# Altium footprint library Connectors THD.PcbLib: 631 footprints (part 13 of 46) (continued)
## FCI_54602-908LF [mm] "1 Port, 8 Positions, CAT3 RJ45 Horizontal Modular Jack"
height 10
pads (10):
  round 1.5 hole 0.8: 1(4.445,1.27) 2(3.175,-1.27) 3(1.905,1.27) 4(0.635,-1.27) 5(-0.635,1.27) 6(-1.905,-1.27) 7(-3.171,1.27) 8(-4.445,-1.27)
  round 1 hole 3.2 unplated mask+1.1: M1(-5.715,7.62) M2(5.715,7.62)
Top Overlay:
  lines w0.2: -6.6,-2.46 -6.6,-2.5 6.6,-2.5 6.6,-2.46 ; -7.65,-2.46 7.65,-2.46 7.65,15.24 -7.65,15.24 -7.65,-2.46
  text "1" at 6.03,0.6 h1.2
Mechanical 8:
  circle w0.1: c5.715,7.62 r1.6
  circle w0.1: c-5.715,7.62 r1.6
  circle w0.1: c4.445,1.27 r0.415
  circle w0.1: c-3.175,1.27 r0.415
  circle w0.1: c-4.445,-1.27 r0.415
  circle w0.1: c3.175,-1.27 r0.415
  lines w0.1: -6.215,7.62 -5.715,7.62 ; -5.715,7.12 -5.715,7.62 ; -5.715,8.12 -5.715,7.62 ; -5.215,7.62 -5.715,7.62 ; -4.945,-1.27 -4.445,-1.27 ; -4.445,-1.77 -4.445,-1.27 ; -4.445,-0.77 -4.445,-1.27 ; -3.945,-1.27 -4.445,-1.27 ; -3.675,1.27 -3.175,1.27 ; -3.175,0.77 -3.175,1.27 ; -3.175,1.77 -3.175,1.27 ; -2.675,1.27 -3.175,1.27 ; -2.405,-1.27 -1.905,-1.27 ; -1.905,-1.77 -1.905,-1.27 ; -1.905,-0.77 -1.905,-1.27 ; -1.405,-1.27 -1.905,-1.27 ; -1.135,1.27 -0.635,1.27 ; -0.635,0.77 -0.635,1.27 ; -0.635,1.77 -0.635,1.27 ; -0.5,0 0,0 ; -0.135,1.27 -0.635,1.27 ; 0,-0.5 0,0 ; 0,0.5 0,0 ; 0.135,-1.27 0.635,-1.27 ; 0.5,0 0,0 ; 0.635,-1.77 0.635,-1.27 ; 0.635,-0.77 0.635,-1.27 ; 1.135,-1.27 0.635,-1.27 ; 1.405,1.27 1.905,1.27 ; 1.905,0.77 1.905,1.27 ; 1.905,1.77 1.905,1.27 ; 2.405,1.27 1.905,1.27 ; 2.675,-1.27 3.175,-1.27 ; 3.175,-1.77 3.175,-1.27 ; 3.175,-0.77 3.175,-1.27 ; 3.675,-1.27 3.175,-1.27 ; 3.945,1.27 4.445,1.27 ; 4.445,0.77 4.445,1.27 ; 4.445,1.77 4.445,1.27 ; 4.945,1.27 4.445,1.27 ; 5.215,7.62 5.715,7.62 ; 5.715,7.12 5.715,7.62 ; 5.715,8.12 5.715,7.62 ; 6.215,7.62 5.715,7.62
Mechanical 14:
  lines w0.1: -6.6,-2.46 -6.6,-2.5 6.6,-2.5 6.6,-2.46 ; -7.65,-2.46 7.65,-2.46 7.65,15.24 -7.65,15.24 -7.65,-2.46
  text "1" at 6.03,0.6 h1.2
3D body: height 12.7, standoff -3.5, extent -7.65,-2.5 7.65,15.24

## FCI_72309-8034BLF [mm] "Dual USB Type A 4 Pin Receptacle, Right Angle, Shielded"
height 15.5
pads (12):
  round 1.6 hole 0.9: A1(-3.5,1.31) A2(-1,1.31) A3(1,1.31) A4(3.5,1.31) B1(-3.5,-1.31) B2(-1,-1.31) B3(1,-1.31) B4(3.5,-1.31)
  round 3 hole 2.3: SH(-6.57,-4.02) SH(-6.57,1.66) SH(6.57,-4.02) SH(6.57,1.66)
Top Overlay:
  circle w0.5: c-3.525,3.525 r0.25
  lines w0.2: -6.555,-14.214 -6.555,-14.3 ccw(c-5.95,-14.3) -5.973,-14.905 -0.78,-15.1 ccw(c-0.755,-14.433) -0.305,-14.925 -0.511,-14.7 cw(c-0.755,-14.433) -0.769,-14.795 -5.961,-14.6 cw(c-5.95,-14.3) -6.25,-14.3 -6.25,-13.68 cw(c-6.87,-13.68) -6.87,-14.3 -7.25,-14.301 -7.25,-13.995 -6.87,-13.995 ccw(c-6.87,-13.68) -6.555,-13.68 ; -6.555,-5.82 -6.555,-13.68 ; -6.555,-2.22 -6.555,-0.14 ; -6.2,-13.68 -6.2,-14.3 6.2,-14.3 6.2,-13.68 ; -5.6,-14.3 -5.6,-13.68 ; -5.6,-13.995 5.6,-13.995 ; -5.102,2.701 5.086,2.7 ; -4.094,-13.68 -6.555,-13.68 ; -4.085,-13.724 -4.602,-6.88 -4,-6.88 -3.55,-12.84 -2.45,-12.84 -2,-6.88 -1.398,-6.88 -1.915,-13.73 -4.085,-13.73 ; 0.755,-14.795 5.961,-14.6 ccw(c5.95,-14.3) 6.25,-14.3 6.25,-13.68 ccw(c6.87,-13.68) 6.87,-14.3 7.25,-14.3 7.25,-13.995 6.87,-13.995 cw(c6.87,-13.68) 6.555,-13.68 ; 0.769,-14.795 cw(c0.755,-14.433) 0.511,-14.7 0.305,-14.925 ccw(c0.755,-14.433) 0.78,-15.1 5.973,-14.905 ccw(c5.95,-14.3) 6.555,-14.3 6.555,-14.214 ; 1.915,-13.73 4.085,-13.73 4.602,-6.88 4,-6.88 3.55,-12.84 2.45,-12.84 2,-6.88 1.398,-6.88 1.915,-13.724 ; 4.088,-13.68 6.555,-13.68 ; 5.6,-14.3 5.6,-13.68 ; 6.555,-5.82 6.555,-13.68 ; 6.555,-2.22 6.555,-0.14
  text "B" at -5.613,-1.75 h1
  text "1" at -3.685,-3.5 h1
  text "4" at 3.148,-3.5 h1
Mechanical 8:
  lines w0.1: -7.07,-4.02 -6.57,-4.02 ; -7.07,1.66 -6.57,1.66 ; -6.57,-4.52 -6.57,-4.02 ; -6.57,-3.52 -6.57,-4.02 ; -6.57,1.16 -6.57,1.66 ; -6.57,2.16 -6.57,1.66 ; -6.07,-4.02 -6.57,-4.02 ; -6.07,1.66 -6.57,1.66 ; -4,-1.31 -3.5,-1.31 ; -4,1.31 -3.5,1.31 ; -3.5,-1.81 -3.5,-1.31 ; -3.5,-0.81 -3.5,-1.31 ; -3.5,0.81 -3.5,1.31 ; -3.5,1.81 -3.5,1.31 ; -3,-1.31 -3.5,-1.31 ; -3,1.31 -3.5,1.31 ; -1.5,-1.31 -1,-1.31 ; -1.5,1.31 -1,1.31 ; -1,-1.81 -1,-1.31 ; -1,-0.81 -1,-1.31 ; -1,0.81 -1,1.31 ; -1,1.81 -1,1.31 ; -0.5,-1.31 -1,-1.31 ; -0.5,0 0,0 ; -0.5,1.31 -1,1.31 ; 0,-0.5 0,0 ; 0,0.5 0,0 ; 0.5,-1.31 1,-1.31 ; 0.5,0 0,0 ; 0.5,1.31 1,1.31 ; 1,-1.81 1,-1.31 ; 1,-0.81 1,-1.31 ; 1,0.81 1,1.31 ; 1,1.81 1,1.31 ; 1.5,-1.31 1,-1.31 ; 1.5,1.31 1,1.31 ; 3,-1.31 3.5,-1.31 ; 3,1.31 3.5,1.31 ; 3.5,-1.81 3.5,-1.31 ; 3.5,-0.81 3.5,-1.31 ; 3.5,0.81 3.5,1.31 ; 3.5,1.81 3.5,1.31 ; 4,-1.31 3.5,-1.31 ; 4,1.31 3.5,1.31 ; 6.07,-4.02 6.57,-4.02 ; 6.07,1.66 6.57,1.66 ; 6.57,-4.52 6.57,-4.02 ; 6.57,-3.52 6.57,-4.02 ; 6.57,1.16 6.57,1.66 ; 6.57,2.16 6.57,1.66 ; 7.07,-4.02 6.57,-4.02 ; 7.07,1.66 6.57,1.66
Mechanical 14:
  lines w0.1: -6.555,-14.214 -6.555,-14.3 ccw(c-5.95,-14.3) -5.973,-14.905 -0.78,-15.1 ccw(c-0.755,-14.433) -0.305,-14.925 -0.511,-14.7 cw(c-0.755,-14.433) -0.769,-14.795 -5.961,-14.6 cw(c-5.95,-14.3) -6.25,-14.3 -6.25,-13.68 cw(c-6.87,-13.68) -6.87,-14.3 -7.25,-14.301 -7.25,-13.995 -6.87,-13.995 ccw(c-6.87,-13.68) -6.555,-13.68 ; -6.555,1 -7.5,1 -7.5,2 -6.555,2 ; -6.555,2.701 6.555,2.7 ; -6.25,2.7 -6.25,2.918 -6.555,2.918 -6.555,-13.68 ; -6.2,-13.68 -6.2,-14.3 6.2,-14.3 6.2,-13.68 ; -5.6,-14.3 -5.6,-13.68 ; -5.6,-13.995 5.6,-13.995 ; -4.094,-13.68 -6.555,-13.68 ; -4.085,-13.724 -4.602,-6.88 -4,-6.88 -3.55,-12.84 -2.45,-12.84 -2,-6.88 -1.398,-6.88 -1.915,-13.73 -4.085,-13.73 ; 0.755,-14.795 5.961,-14.6 ccw(c5.95,-14.3) 6.25,-14.3 6.25,-13.68 ccw(c6.87,-13.68) 6.87,-14.3 7.25,-14.3 7.25,-13.995 6.87,-13.995 cw(c6.87,-13.68) 6.555,-13.68 ; 0.769,-14.795 cw(c0.755,-14.433) 0.511,-14.7 0.305,-14.925 ccw(c0.755,-14.433) 0.78,-15.1 5.973,-14.905 ccw(c5.95,-14.3) 6.555,-14.3 6.555,-14.214 ; 1.915,-13.73 4.085,-13.73 4.602,-6.88 4,-6.88 3.55,-12.84 2.45,-12.84 2,-6.88 1.398,-6.88 1.915,-13.724 ; 4.088,-13.68 6.555,-13.68 ; 5.6,-14.3 5.6,-13.68 ; 6.25,2.7 6.25,2.918 6.555,2.918 6.555,-13.68 ; 6.555,1 7.5,1 7.5,2 6.555,2
  text "B" at -5.613,-1.75 h1
  text "1" at -3.685,-3.5 h1
  text "4" at 3.148,-3.5 h1
3D body: height 16.19, standoff -2.8, extent -7.5,-15.099 7.5,2.918

## FCI_76341-312LF [mm] "2.54mm (.100\") Pitch, 12 Circuits  Single Row  Top Entry Through Mount Receptacle"
height 7
pads (12):
  round 1.5 hole 0.8: 1(-13.97,0) 2(-11.43,0) 3(-8.89,0) 4(-6.35,0) 5(-3.81,0) 6(-1.27,0) 7(1.27,0) 8(3.81,0) 9(6.35,0) 10(8.89,0) 11(11.43,0) 12(13.97,0)
Top Overlay:
  circle w0.3: c-14.478,1.778 r0.15
  lines w0.2: -15.2,-1.27 -15.2,1.27 15.2,1.27 15.2,-1.27 -15.2,-1.27
Mechanical 8:
  lines w0.1: -14.47,0 -13.97,0 ; -13.97,-0.5 -13.97,0 ; -13.97,0.5 -13.97,0 ; -13.47,0 -13.97,0 ; -11.93,0 -11.43,0 ; -11.43,-0.5 -11.43,0 ; -11.43,0.5 -11.43,0 ; -10.93,0 -11.43,0 ; -9.39,0 -8.89,0 ; -8.89,-0.5 -8.89,0 ; -8.89,0.5 -8.89,0 ; -8.39,0 -8.89,0 ; -6.85,0 -6.35,0 ; -6.35,-0.5 -6.35,0 ; -6.35,0.5 -6.35,0 ; -5.85,0 -6.35,0 ; -4.31,0 -3.81,0 ; -3.81,-0.5 -3.81,0 ; -3.81,0.5 -3.81,0 ; -3.31,0 -3.81,0 ; -1.77,0 -1.27,0 ; -1.27,-0.5 -1.27,0 ; -1.27,0.5 -1.27,0 ; -0.77,0 -1.27,0 ; -0.5,0 0,0 ; 0,-0.5 0,0 ; 0,0.5 0,0 ; 0.5,0 0,0 ; 0.77,0 1.27,0 ; 1.27,-0.5 1.27,0 ; 1.27,0.5 1.27,0 ; 1.77,0 1.27,0 ; 3.31,0 3.81,0 ; 3.81,-0.5 3.81,0 ; 3.81,0.5 3.81,0 ; 4.31,0 3.81,0 ; 5.85,0 6.35,0 ; 6.35,-0.5 6.35,0 ; 6.35,0.5 6.35,0 ; 6.85,0 6.35,0 ; 8.39,0 8.89,0 ; 8.89,-0.5 8.89,0 ; 8.89,0.5 8.89,0 ; 9.39,0 8.89,0 ; 10.93,0 11.43,0 ; 11.43,-0.5 11.43,0 ; 11.43,0.5 11.43,0 ; 11.93,0 11.43,0 ; 13.47,0 13.97,0 ; 13.97,-0.5 13.97,0 ; 13.97,0.5 13.97,0 ; 14.47,0 13.97,0
Mechanical 14:
  circle w0.3: c-14.478,1.778 r0.15
  lines w0.1: -14.77,-0.8 -13.17,-0.8 ; -14.77,-0.8 -14.77,0.8 ; -14.77,-0.8 -14.47,-0.5 ; -14.77,0.8 -13.17,0.8 ; -14.77,0.8 -14.47,0.5 ; -14.47,-0.5 -14.47,0.5 ; -14.47,-0.5 -13.47,-0.5 ; -14.47,0.5 -13.47,0.5 ; -13.47,-0.5 -13.17,-0.8 ; -13.47,-0.5 -13.47,0.5 ; -13.47,0.5 -13.17,0.8 ; -13.17,-0.8 -13.17,0.8 ; -12.23,-0.8 -10.63,-0.8 ; -12.23,-0.8 -12.23,0.8 ; -12.23,-0.8 -11.93,-0.5 ; -12.23,0.8 -10.63,0.8 ; -12.23,0.8 -11.93,0.5 ; -11.93,-0.5 -11.93,0.5 ; -11.93,-0.5 -10.93,-0.5 ; -11.93,0.5 -10.93,0.5 ; -10.93,-0.5 -10.63,-0.8 ; -10.93,-0.5 -10.93,0.5 ; -10.93,0.5 -10.63,0.8 ; -10.63,-0.8 -10.63,0.8 ; -9.69,-0.8 -8.09,-0.8 ; -9.69,-0.8 -9.69,0.8 ; -9.69,-0.8 -9.39,-0.5 ; -9.69,0.8 -8.09,0.8 ; -9.69,0.8 -9.39,0.5 ; -9.39,-0.5 -9.39,0.5 ; -9.39,-0.5 -8.39,-0.5 ; -9.39,0.5 -8.39,0.5 ; -8.39,-0.5 -8.09,-0.8 ; -8.39,-0.5 -8.39,0.5 ; -8.39,0.5 -8.09,0.8 ; -8.09,-0.8 -8.09,0.8 ; -7.15,-0.8 -5.55,-0.8 ; -7.15,-0.8 -7.15,0.8 ; -7.15,-0.8 -6.85,-0.5 ; -7.15,0.8 -5.55,0.8 ; -7.15,0.8 -6.85,0.5 ; -6.85,-0.5 -6.85,0.5 ; -6.85,-0.5 -5.85,-0.5 ; -6.85,0.5 -5.85,0.5 ; -5.85,-0.5 -5.55,-0.8 ; -5.85,-0.5 -5.85,0.5 ; -5.85,0.5 -5.55,0.8 ; -5.55,-0.8 -5.55,0.8 ; -4.61,-0.8 -3.01,-0.8 ; -4.61,-0.8 -4.61,0.8 ; -4.61,-0.8 -4.31,-0.5 ; -4.61,0.8 -3.01,0.8 ; -4.61,0.8 -4.31,0.5 ; -4.31,-0.5 -4.31,0.5 ; -4.31,-0.5 -3.31,-0.5 ; -4.31,0.5 -3.31,0.5 ; -3.31,-0.5 -3.01,-0.8 ; -3.31,-0.5 -3.31,0.5 ; -3.31,0.5 -3.01,0.8 ; -3.01,-0.8 -3.01,0.8 ; -2.07,-0.8 -0.47,-0.8 ; -2.07,-0.8 -2.07,0.8 ; -2.07,-0.8 -1.77,-0.5 ; -2.07,0.8 -0.47,0.8 ; -2.07,0.8 -1.77,0.5 ; -1.77,-0.5 -1.77,0.5 ; -1.77,-0.5 -0.77,-0.5 ; -1.77,0.5 -0.77,0.5 ; -0.77,-0.5 -0.47,-0.8 ; -0.77,-0.5 -0.77,0.5 ; -0.77,0.5 -0.47,0.8 ; -0.47,-0.8 -0.47,0.8 ; 0.47,-0.8 2.07,-0.8 ; 0.47,-0.8 0.47,0.8 ; 0.47,-0.8 0.77,-0.5 ; 0.47,0.8 2.07,0.8 ; 0.47,0.8 0.77,0.5 ; 0.77,-0.5 0.77,0.5 ; 0.77,-0.5 1.77,-0.5 ; 0.77,0.5 1.77,0.5 ; 1.77,-0.5 2.07,-0.8 ; 1.77,-0.5 1.77,0.5 ; 1.77,0.5 2.07,0.8 ; 2.07,-0.8 2.07,0.8 ; 3.01,-0.8 4.61,-0.8 ; 3.01,-0.8 3.01,0.8 ; 3.01,-0.8 3.31,-0.5 ; 3.01,0.8 4.61,0.8 ; 3.01,0.8 3.31,0.5 ; 3.31,-0.5 3.31,0.5 ; 3.31,-0.5 4.31,-0.5 ; 3.31,0.5 4.31,0.5 ; 4.31,-0.5 4.61,-0.8 ; 4.31,-0.5 4.31,0.5 ; 4.31,0.5 4.61,0.8 ; 4.61,-0.8 4.61,0.8 ; 5.55,-0.8 7.15,-0.8 ; 5.55,-0.8 5.55,0.8 ; 5.55,-0.8 5.85,-0.5 ; 5.55,0.8 7.15,0.8 ; 5.55,0.8 5.85,0.5 ; 5.85,-0.5 5.85,0.5 ; 5.85,-0.5 6.85,-0.5 ; 5.85,0.5 6.85,0.5 ; 6.85,-0.5 7.15,-0.8 ; 6.85,-0.5 6.85,0.5 ; 6.85,0.5 7.15,0.8 ; 7.15,-0.8 7.15,0.8 ; 8.09,-0.8 9.69,-0.8 ; 8.09,-0.8 8.09,0.8 ; 8.09,-0.8 8.39,-0.5 ; 8.09,0.8 9.69,0.8 ; 8.09,0.8 8.39,0.5 ; 8.39,-0.5 8.39,0.5 ; 8.39,-0.5 9.39,-0.5 ; 8.39,0.5 9.39,0.5 ; 9.39,-0.5 9.69,-0.8 ; 9.39,-0.5 9.39,0.5 ; 9.39,0.5 9.69,0.8 ; 9.69,-0.8 9.69,0.8 ; 10.63,-0.8 12.23,-0.8 ; 10.63,-0.8 10.63,0.8 ; 10.63,-0.8 10.93,-0.5 ; 10.63,0.8 12.23,0.8 ; 10.63,0.8 10.93,0.5 ; 10.93,-0.5 10.93,0.5 ; 10.93,-0.5 11.93,-0.5 ; 10.93,0.5 11.93,0.5 ; 11.93,-0.5 12.23,-0.8 ; 11.93,-0.5 11.93,0.5 ; 11.93,0.5 12.23,0.8 ; 12.23,-0.8 12.23,0.8 ; 13.17,-0.8 14.77,-0.8 ; 13.17,-0.8 13.17,0.8 ; 13.17,-0.8 13.47,-0.5 ; 13.17,0.8 14.77,0.8 ; 13.17,0.8 13.47,0.5 ; 13.47,-0.5 13.47,0.5 ; 13.47,-0.5 14.47,-0.5 ; 13.47,0.5 14.47,0.5 ; 14.47,-0.5 14.77,-0.8 ; 14.47,-0.5 14.47,0.5 ; 14.47,0.5 14.77,0.8 ; 14.77,-0.8 14.77,0.8 ; -15.2,-1.27 -15.2,1.27 15.2,1.27 15.2,-1.27 -15.2,-1.27
3D body: height 7, standoff -2.96, extent -15.2,-1.27 15.2,1.27

## FCI_87520-0010BLF [mm] "USB 2.0 Type A Receptacle, 4 Pins, Right Angle, Shielded"
height 7.7
pads (6):
  round 1.6 hole 0.9: 1(-3.5,0) 2(-1,0) 3(1,0) 4(3.5,0)
  round 2.8 hole 2.3: 5(-6.57,-2.71) 5(6.57,-2.71)
Top Overlay:
  circle w0.5: c-3.515,2 r0.25
  lines w0.2: -6.537,-12.26 6.563,-12.26 ; -6.537,-4.46 -6.537,-12.41 cw(c-6.837,-12.41) -6.837,-12.71 -7.237,-12.71 -7.237,-13.01 -6.837,-13.01 ccw(c-6.837,-12.41) -6.237,-12.41 -6.237,-12.26 ; -6.537,-0.96 -6.537,0.99 -4.075,0.99 ; -5.537,-12.71 5.563,-12.71 ; -5.537,-12.26 -5.537,-13.01 5.563,-13.01 5.563,-12.26 ; 4.101,0.99 6.563,0.99 6.563,-0.96 ; 6.263,-12.26 6.263,-12.41 ccw(c6.863,-12.41) 6.863,-13.01 7.263,-13.01 7.263,-12.71 6.863,-12.71 cw(c6.863,-12.41) 6.563,-12.41 6.563,-4.46
  text "1" at -3.66,-2.5 h1
  text "4" at 3.173,-2.5 h1
Mechanical 8:
  circle w0.1: c6.57,-2.71 r1.15
  circle w0.1: c3.487,0 r0.5
  circle w0.1: c-3.5,0 r0.5
  circle w0.1: c1,0 r0.5
  circle w0.1: c-1.013,0 r0.5
  circle w0.1: c-6.57,-2.71 r1.15
  lines w0.1: -7.57,-2.71 -6.57,-2.71 ; -6.57,-3.71 -6.57,-2.71 ; -6.537,-9 6.563,-9 ; -4.5,0 -3.5,0 ; -3.5,-2.71 -3.5,0 ; -3.5,-1 -3.5,0 ; -2,0 -1,0 ; -1,-2.71 -1,0 ; -1,-1 -1,0 ; 0,-2.71 0,0 ; 0.013,-13.01 0.013,0.99 ; 0.013,0 1.013,0 1.013,-1 ; 1,-2.71 1,0 ; 2.5,0 3.5,0 ; 3.5,-2.71 3.5,0 ; 3.5,-1 3.5,0 ; 5.57,-2.71 6.57,-2.71 ; 6.263,-13.01 7.263,-13.01 ; 6.563,-12.71 7.263,-12.71 ; 6.57,-3.71 6.57,-2.71 ; -6.57,-2.71 6.57,-2.71 ; -3.5,0 3.5,0 ; -3.713,-0.15 -3.713,0.15 -3.313,0.15 -3.313,-0.15 -3.713,-0.15 ; -1.213,-0.15 -1.213,0.15 -0.813,0.15 -0.813,-0.15 -1.213,-0.15 ; 0.8,-0.15 0.8,0.15 1.2,0.15 1.2,-0.15 0.8,-0.15 ; 3.287,-0.15 3.287,0.15 3.687,0.15 3.687,-0.15 3.287,-0.15
Mechanical 14:
  lines w0.1: -6.537,-12.26 6.563,-12.26 ; -6.237,-12.26 -6.237,-12.41 cw(c-6.837,-12.41) -6.837,-13.01 -7.237,-13.01 -7.237,-12.71 -6.837,-12.71 ccw(c-6.837,-12.41) -6.537,-12.41 -6.537,0.99 6.563,0.99 6.563,-12.41 ccw(c6.863,-12.41) 6.863,-12.71 7.263,-12.71 7.263,-13.01 6.863,-13.01 cw(c6.863,-12.41) 6.263,-12.41 6.263,-12.26 ; -5.537,-12.71 5.563,-12.71 ; -5.537,-12.26 -5.537,-13.01 5.563,-13.01 5.563,-12.26
  text "1" at -3.66,-2.5 h1
  text "4" at 3.173,-2.5 h1
3D body: height 7.55, standoff -3.3, extent -7.9,-13.05 7.9,1.11

## FCI_87606-310LF [mm] "20 Contacts - Pitch 2.54mm - Top Entry, Dual Row Through Mount Receptacle"
height 8.5
pads (20):
  round 1.5 hole 0.9: 1(-11.43,1.27) 2(-11.43,-1.27) 3(-8.89,1.27) 4(-8.89,-1.27) 5(-6.35,1.27) 6(-6.35,-1.27) 7(-3.81,1.27) 8(-3.81,-1.27) 9(-1.27,1.27) 10(-1.27,-1.27) 11(1.27,1.27) 12(1.27,-1.27) 13(3.81,1.27) 14(3.81,-1.27) 15(6.35,1.27) 16(6.35,-1.27) 17(8.89,1.27) 18(8.89,-1.27) 19(11.43,1.27) 20(11.43,-1.27)
Top Overlay:
  circle w0.3: c-11.357,3.048 r0.15
  lines w0.2: -12.66,-2.54 12.66,-2.54 12.66,2.54 -12.66,2.54 -12.66,-2.54
  text "1" at -13.462,0.762 h1.02
  text "20" at 13.081,-1.651 h1.02
Mechanical 14:
  drawing of 244 lines, arcs and shapes, not listed
  text "1" at -13.462,0.762 h1.02
  text "20" at 13.081,-1.651 h1.02
3D body: height 8.5, standoff -2.9, extent -12.7,-2.54 12.7,2.54

## FCI_87606-313LF [mm] "26 Contacts - Pitch 2.54mm - Top Entry, Dual Row Through Mount Receptacle"
height 8.5
pads (26):
  round 1.5 hole 0.9: 1(-15.24,1.27) 2(-15.24,-1.27) 3(-12.7,1.27) 4(-12.7,-1.27) 5(-10.16,1.27) 6(-10.16,-1.27) 7(-7.62,1.27) 8(-7.62,-1.27) 9(-5.08,1.27) 10(-5.08,-1.27) 11(-2.54,1.27) 12(-2.54,-1.27) 13(0,1.27) 14(0,-1.27) 15(2.54,1.27) 16(2.54,-1.27) 17(5.08,1.27) 18(5.08,-1.27) 19(7.62,1.27) 20(7.62,-1.27) 21(10.16,1.27) 22(10.16,-1.27) 23(12.7,1.27) 24(12.7,-1.27) 25(15.24,1.27) 26(15.24,-1.27)
Top Overlay:
  circle w0.3: c-15.167,3.048 r0.15
  lines w0.2: -16.47,-2.54 16.47,-2.54 16.47,2.54 -16.47,2.54 -16.47,-2.54
  text "1" at -17.272,0.762 h1.02
  text "26" at 16.891,-1.651 h1.02
Mechanical 14:
  drawing of 316 lines, arcs and shapes, not listed
  text "26" at 16.891,-1.651 h1.02
  text "1" at -17.272,0.762 h1.02
3D body: height 8.5, standoff -2.9, extent -16.51,-2.54 16.51,2.54

## FCI_87606-317LF [mm] "34 Contacts - Pitch 2.54mm - Top Entry, Dual Row Through Mount Receptacle"
height 8.5
pads (34):
  round 1.5 hole 0.9: 1(-20.32,1.27) 2(-20.32,-1.27) 3(-17.78,1.27) 4(-17.78,-1.27) 5(-15.24,1.27) 6(-15.24,-1.27) 7(-12.7,1.27) 8(-12.7,-1.27) 9(-10.16,1.27) 10(-10.16,-1.27) 11(-7.62,1.27) 12(-7.62,-1.27) 13(-5.08,1.27) 14(-5.08,-1.27) 15(-2.54,1.27) 16(-2.54,-1.27) 17(0,1.27) 18(0,-1.27) 19(2.54,1.27) 20(2.54,-1.27) 21(5.08,1.27) 22(5.08,-1.27) 23(7.62,1.27) 24(7.62,-1.27) 25(10.16,1.27) 26(10.16,-1.27) 27(12.7,1.27) 28(12.7,-1.27) 29(15.24,1.27) 30(15.24,-1.27) 31(17.78,1.27) 32(17.78,-1.27) 33(20.32,1.27) 34(20.32,-1.27)
Top Overlay:
  circle w0.3: c-20.247,3.048 r0.15
  lines w0.2: -21.55,-2.54 -21.55,2.54 21.55,2.54 21.55,-2.54 -21.55,-2.54
  text "1" at -22.352,0.762 h1.02
  text "34" at 21.971,-1.651 h1.02
Mechanical 14:
  drawing of 413 lines, arcs and shapes, not listed
  text "1" at -22.352,0.762 h1.02
  text "34" at 21.971,-1.651 h1.02
3D body: height 8.5, standoff -2.9, extent -21.59,-2.54 21.59,2.54

## FCI_87606-320LF [mm] "40 Contacts - Pitch 2.54mm - Top Entry, Dual Row Through Mount Receptacle"
height 8.5
pads (40):
  round 1.5 hole 0.9: 1(-24.13,1.27) 2(-24.13,-1.27) 3(-21.59,1.27) 4(-21.59,-1.27) 5(-19.05,1.27) 6(-19.05,-1.27) 7(-16.51,1.27) 8(-16.51,-1.27) 9(-13.97,1.27) 10(-13.97,-1.27) 11(-11.43,1.27) 12(-11.43,-1.27) 13(-8.89,1.27) 14(-8.89,-1.27) 15(-6.35,1.27) 16(-6.35,-1.27) 17(-3.81,1.27) 18(-3.81,-1.27) 19(-1.27,1.27) 20(-1.27,-1.27) 21(1.27,1.27) 22(1.27,-1.27) 23(3.81,1.27) 24(3.81,-1.27) 25(6.35,1.27) 26(6.35,-1.27) 27(8.89,1.27) 28(8.89,-1.27) 29(11.43,1.27) 30(11.43,-1.27) 31(13.97,1.27) 32(13.97,-1.27) 33(16.51,1.27) 34(16.51,-1.27) 35(19.05,1.27) 36(19.05,-1.27) 37(21.59,1.27) 38(21.59,-1.27) 39(24.13,1.27) 40(24.13,-1.27)
Top Overlay:
  circle w0.3: c-24.057,3.048 r0.15
  lines w0.2: -25.36,-2.54 -25.36,2.54 25.36,2.54 25.36,-2.54 -25.36,-2.54
  text "40" at 25.781,-1.651 h1.02
  text "1" at -26.162,0.762 h1.02
Mechanical 14:
  drawing of 485 lines, arcs and shapes, not listed
  text "40" at 25.781,-1.651 h1.02
  text "1" at -26.162,0.762 h1.02
3D body: height 8.5, standoff -2.9, extent -25.4,-2.54 25.4,2.54

## FCI_87606-325LF [mm] "50 Contacts - Pitch 2.54mm - Top Entry, Dual Row Through Mount Receptacle"
height 8.5
pads (50):
  round 1.5 hole 0.9: 1(-30.48,1.27) 2(-30.48,-1.27) 3(-27.94,1.27) 4(-27.94,-1.27) 5(-25.4,1.27) 6(-25.4,-1.27) 7(-22.86,1.27) 8(-22.86,-1.27) 9(-20.32,1.27) 10(-20.32,-1.27) 11(-17.78,1.27) 12(-17.78,-1.27) 13(-15.24,1.27) 14(-15.24,-1.27) 15(-12.7,1.27) 16(-12.7,-1.27) 17(-10.16,1.27) 18(-10.16,-1.27) 19(-7.62,1.27) 20(-7.62,-1.27) 21(-5.08,1.27) 22(-5.08,-1.27) 23(-2.54,1.27) 24(-2.54,-1.27) 25(0,1.27) 26(0,-1.27) 27(2.54,1.27) 28(2.54,-1.27) 29(5.08,1.27) 30(5.08,-1.27) 31(7.62,1.27) 32(7.62,-1.27) 33(10.16,1.27) 34(10.16,-1.27) 35(12.7,1.27) 36(12.7,-1.27) 37(15.24,1.27) 38(15.24,-1.27) 39(17.78,1.27) 40(17.78,-1.27) 41(20.32,1.27) 42(20.32,-1.27) 43(22.86,1.27) 44(22.86,-1.27) 45(25.4,1.27) 46(25.4,-1.27) 47(27.94,1.27) 48(27.94,-1.27) 49(30.48,1.27) 50(30.48,-1.27)
Top Overlay:
  circle w0.3: c-30.407,3.048 r0.15
  lines w0.2: -31.71,-2.54 31.71,-2.54 31.71,2.54 -31.71,2.54 -31.71,-2.54
  text "1" at -32.512,0.762 h1.02
  text "50" at 32.131,-1.651 h1.02
Mechanical 14:
  drawing of 605 lines, arcs and shapes, not listed
  text "50" at 32.131,-1.651 h1.02
  text "1" at -32.512,0.761 h1.02
3D body: height 8.5, standoff -2.9, extent -31.85,-2.54 31.85,2.54

## FCI_10074141-001LF [mm] "1.27mm (.050\") Pitch, eSATA Right-Angle, Upright Plug, Through-Hole Solder"
height 19.6
pads (11):
  round 1.1 hole 0.75: 1(0.5,-1.79) 2(-0.5,-0.52) 3(-0.5,0.75) 4(0.5,2.02) 5(-0.5,3.29) 6(-0.5,4.56) 7(0.5,5.83)
  round 2.05 hole 1.7: 8(-2.2,-3.75) 8(-2.2,3.75) 8(2.2,-3.75) 8(2.2,3.75)
Top Overlay:
  lines w0.2: -3.853,-12.9 -2.493,-12.9 ccw(c-2.619,-12.321) -2.04,-12.447 -2.04,-12.287 ; -3.293,-7.8 -3.293,-4.624 ; -3.293,-7.593 -2.333,-7.593 ; -3.293,-6.287 -2.333,-6.287 ; -3.293,-2.876 -3.293,2.723 ; -3.293,4.777 -3.293,7.02 3.293,7.02 3.293,4.777 ; -2.653,-12.9 -2.653,-13.3 -3.853,-13.3 -3.853,-12.58 -2.493,-12.58 ccw(c-2.493,-12.42) -2.333,-12.42 -2.333,-5.144 ; -2.333,-12.287 -1.907,-12.287 cw(c-1.907,-12.447) -1.747,-12.447 ; -2.333,-10.927 -2.561,-10.813 -2.333,-10.5 ; -2.333,-2.356 -2.333,2.256 ; -2.333,5.244 -2.333,7.02 ; -1.747,-12.447 -1.747,-12.9 1.747,-12.9 1.747,-12.447 ; 1.747,-12.447 cw(c1.907,-12.447) 1.907,-12.287 2.333,-12.287 ; 2.04,-12.287 2.04,-12.447 ccw(c2.619,-12.321) 2.493,-12.9 3.853,-12.9 ; 2.333,-10.927 2.561,-10.813 2.333,-10.5 ; 2.333,-7.593 3.293,-7.593 ; 2.333,-6.287 3.293,-6.287 ; 2.333,-5.244 2.333,-12.42 ccw(c2.493,-12.42) 2.493,-12.58 3.853,-12.58 3.853,-13.3 2.653,-13.3 2.653,-12.9 ; 2.333,-2.256 2.333,2.256 ; 2.333,5.244 2.333,7.02 ; 3.293,-7.8 3.293,-4.777 ; 3.293,-2.723 3.293,2.723 ; -3.293,-7.807 -2.333,-7.807 -3.293,-7.807 ; 2.333,-7.807 3.293,-7.807 2.333,-7.807
Mechanical 8:
  lines w0.1: -2.7,-3.75 -2.2,-3.75 ; -2.7,3.75 -2.2,3.75 ; -2.2,-4.25 -2.2,-3.75 ; -2.2,-3.25 -2.2,-3.75 ; -2.2,3.25 -2.2,3.75 ; -2.2,4.25 -2.2,3.75 ; -1.7,-3.75 -2.2,-3.75 ; -1.7,3.75 -2.2,3.75 ; -1,-0.52 -0.5,-0.52 -0.5,-1.02 ; -1,0.75 -0.5,0.75 -0.5,1.25 ; -1,3.29 -0.5,3.29 -0.5,3.79 ; -1,4.56 -0.5,4.56 -0.5,5.06 ; -0.5,0 0,0 ; 0,-0.5 0,0 ; 0,0.5 0,0 ; 0,5.83 0.5,5.83 0.5,6.33 ; 0.5,-2.29 0.5,-1.79 1,-1.79 ; 0.5,0 0,0 ; 0.5,1.52 0.5,2.02 1,2.02 ; 1.7,-3.75 2.2,-3.75 ; 1.7,3.75 2.2,3.75 ; 2.2,-4.25 2.2,-3.75 ; 2.2,-3.25 2.2,-3.75 ; 2.2,3.25 2.2,3.75 ; 2.2,4.25 2.2,3.75 ; 2.7,-3.75 2.2,-3.75 ; 2.7,3.75 2.2,3.75
Mechanical 14:
  lines w0.1: -3.853,-12.9 -2.493,-12.9 ccw(c-2.619,-12.321) -2.04,-12.447 -2.04,-12.287 ; -3.293,-7.807 -2.333,-7.807 ; -3.293,-7.8 -3.293,7.02 3.293,7.02 3.293,-7.8 ; -3.293,-7.593 -2.333,-7.593 ; -3.293,-6.287 -2.333,-6.287 ; -2.653,-12.9 -2.653,-13.3 -3.853,-13.3 -3.853,-12.58 -2.493,-12.58 ccw(c-2.493,-12.42) -2.333,-12.42 -2.333,7.02 ; -2.333,-12.287 -1.907,-12.287 cw(c-1.907,-12.447) -1.747,-12.447 ; -2.333,-10.927 -2.561,-10.813 -2.333,-10.5 ; -1.747,-12.447 -1.747,-12.9 1.747,-12.9 1.747,-12.447 ; 1.747,-12.447 cw(c1.907,-12.447) 1.907,-12.287 2.333,-12.287 ; 2.04,-12.287 2.04,-12.447 ccw(c2.619,-12.321) 2.493,-12.9 3.853,-12.9 ; 2.333,-10.927 2.561,-10.813 2.333,-10.5 ; 2.333,-7.807 3.293,-7.807 ; 2.333,-7.593 3.293,-7.593 ; 2.333,-6.287 3.293,-6.287 ; 2.333,7.02 2.333,-12.42 ccw(c2.493,-12.42) 2.493,-12.58 3.853,-12.58 3.853,-13.3 2.653,-13.3 2.653,-12.9
3D body: height 19.15, standoff -2.91, extent -3.85,-13.25 3.85,7.02